# Altium footprint library Pasivos.PcbLib: 138 footprints (part 9 of 9)
Each footprint in its own frame and in the unit in brackets; x right, y up, seen from the top. Pads: shape width x height; smd on the part's side, far side on the other; paste and mask are expansions set on the pad; w line width, h text height; cw(c..) or ccw(c..) is an arc to the next point about the centre after c.
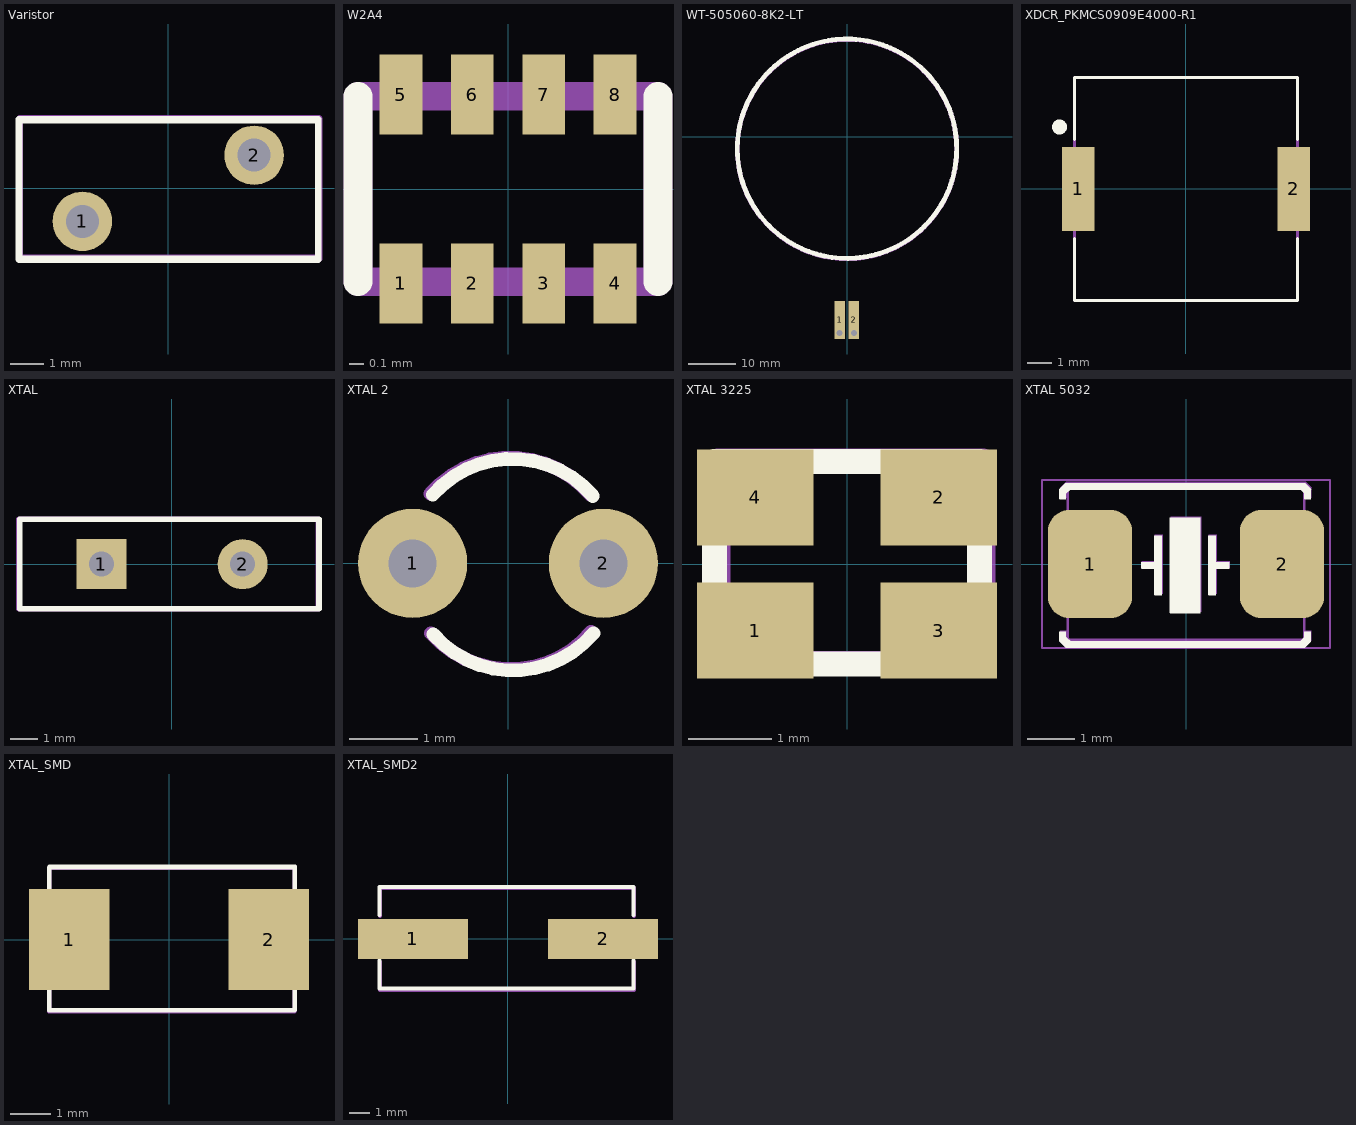
[diagram p8: the footprints below, top view; thin cyan lines are the x and y axes]

## Varistor [mm]
pads (2):
  round 1.8 hole 1: 1(-2.6,-1) 2(2.6,1)
Top Overlay:
  lines w0.2: -4.52,-2.155 4.544,-2.155 4.544,2.067 -4.52,2.067 -4.52,-2.155 ; -4.52,-2.128 -4.52,2.094 4.544,2.094 4.544,-2.128 -4.52,-2.128
Mechanical 29:
  lines w0.2: -4.503,-2.139 -4.503,2.084 4.561,2.084 4.561,-2.139 -4.503,-2.139 ; -4.503,-2.111 4.561,-2.111 4.561,2.111 -4.503,2.111 -4.503,-2.111
  text "'.Designator'" at -3.068,-0.259 h0.5
3D body "V47ZA.step": height 11, standoff -3, extent -4.469,-2.03 4.531,1.97

## W2A4 [mm] "Array capacitor 0508 x 4"
pads (8):
  rect 0.3x0.56 smd: 1(-0.75,-0.66) 2(-0.25,-0.66) 3(0.25,-0.66) 4(0.75,-0.66) 5(-0.75,0.66) 6(-0.25,0.66) 7(0.25,0.66) 8(0.75,0.66)
Top Overlay:
  lines w0.2: -1.05,-0.65 -1.05,0.65 ; 1.05,-0.65 1.05,0.65
Mechanical 15:
  lines w0.2: -1.05,-0.65 -1.05,0.65 1.05,0.65 1.05,-0.65 -1.05,-0.65

## WT-505060-8K2-LT [mm] "TX 1 COIL 1 LAYER 4.95UH"
pads (4):
  round 1.5 hole 1.2 paste+2: 1(-1.58,-41.1) 2(1.46,-41.1)
  rect 2.2x8 smd: 1(-1.56,-38.38) 2(1.44,-38.38)
Top Overlay:
  circle w1: c0,-2.479 r23
Mechanical 29:
  circle w1: c0,-2.57 r23
  text "'.Designator'" at -2.82,-0.127 h0.5

## XDCR_PKMCS0909E4000-R1 [mm] "AUDIO PIEZO TRANSDUCER 12.5V SMD"
pads (2):
  rect 1.3x3.4 smd: 1(-4.35,0) 2(4.35,0)
Top Overlay:
  circle w0.3: c-5.1,2.5 r0.15
  lines w0.127: -4.5,-2 -4.5,-4.5 4.5,-4.5 4.5,-2 ; -4.5,2 -4.5,4.5 4.5,4.5 4.5,2
Mechanical 4:
  lines w0.127: -4.5,-4.5 -4.5,4.5 ; -4.5,-4.5 4.5,-4.5 ; -4.5,-4.5 -4.5,4.5 ; -4.5,-4.5 4.5,-4.5 ; -4.5,4.5 4.5,4.5 ; -4.5,4.5 4.5,4.5 ; 4.5,-4.5 4.5,4.5 ; 4.5,-4.5 4.5,4.5
3D body "PKMCS0909E4000-R1.step": height 1.9, standoff 0, extent -4.5,-4.5 4.5,4.5

## XTAL [mm] "HC49"
pads (2):
  rect 1.8x1.8 hole 0.9: 1(-2.54,0)
  round 1.8 hole 0.9: 2(2.54,0)
Top Overlay:
  lines w0.2: -5.478,-1.601 -5.478,1.61 5.285,1.61 5.285,-1.601 -5.478,-1.601
Mechanical 29:
  lines w0.2: -5.498,-1.598 5.265,-1.598 5.265,1.613 -5.498,1.613 -5.498,-1.598
  text "'.Designator'" at -2.954,-0.198 h0.5
3D body "XTAL2.step": height 2.09, standoff -3.54, extent -5.407,-1.519 5.261,1.529

## XTAL 2 [mm]
pads (2):
  round 1.6 hole 0.7: 1(-1.397,0) 2(1.397,0)
Top Overlay:
  lines w0.2: -1.103,1.004 cw(c0.063,-0.018) 1.242,0.988 ; -1.093,-1.04 ccw(c0.073,-0.018) 1.252,-1.024
Mechanical 29:
  lines w0.2: -1.139,1.022 cw(c0.026,0) 1.205,1.006 ; -1.129,-1.022 ccw(c0.036,0) 1.215,-1.006
  text "'.Designator'" at -1.181,-0.341 h0.5
3D body "TC38 SMD.step": height 8.2, standoff -1.3, extent -1.395,-0.091 1.395,2.159

## XTAL 3225 [mm] "Crytal 32 x 25 mm"
pads (4):
  rect 1.4x1.15 smd: 1(-1.1,-0.8) 2(1.1,0.8) 3(1.1,-0.8) 4(-1.1,0.8)
Top Overlay:
  lines w0.3: -1.59,-1.2 -1.59,1.23 1.59,1.23 1.59,-1.18 1.57,-1.2 -1.59,-1.2
Mechanical 29:
  lines w0.3: -1.549,-1.195 -1.549,1.235 1.631,1.235 1.631,-1.175 1.611,-1.195 -1.549,-1.195
  text "'.Designator'" at -1.164,-0.157 h0.5
3D body "SMD 3225 Crystal.step": height 0.81, standoff 0, extent -1.587,-1.25 1.627,1.25

## XTAL 5032 [mil] "Crytal  0.197\" L x 0.126\" W (5.00mm x 3.20mm)"
height 47.24
pads (2):
  rrect50% 70x90 smd: 1(-80,0) 2(80,0)
Top Overlay:
  region: 103.98,-56.54 98.98,-56.54 98.98,-61.04 95.48,-64.54 -96.52,-64.54 -100.02,-61.04 -100.02,-56.54 -105.02,-56.54 -105.02,-64.54 -100.02,-69.54 98.98,-69.54 103.98,-64.54
  region: -105.02,54.46 -100.02,54.46 -100.02,58.96 -96.52,62.46 95.48,62.46 98.98,58.96 98.98,54.46 103.98,54.46 103.98,62.46 98.98,67.46 -100.02,67.46 -105.02,62.46
  region: -20.02,23.46 -26.02,23.46 -26.02,1.46 -37.02,1.46 -37.02,-3.54 -26.02,-3.54 -26.02,-25.54 -20.02,-25.54
  region: -13.02,38.46 11.98,38.46 11.98,-40.54 -13.02,-40.54
  region: 18.98,-25.54 24.98,-25.54 24.98,-3.54 35.98,-3.54 35.98,1.46 24.98,1.46 24.98,23.46 18.98,23.46
  lines w1: -105.02,-64.54 -100.02,-69.54 98.98,-69.54 103.98,-64.54 103.98,-56.54 98.98,-56.54 98.98,-61.04 95.48,-64.54 -96.52,-64.54 -100.02,-61.04 -100.02,-56.54 -105.02,-56.54 -105.02,-64.54 ; -105.02,54.46 -100.02,54.46 -100.02,58.96 -96.52,62.46 95.48,62.46 98.98,58.96 98.98,54.46 103.98,54.46 103.98,62.46 98.98,67.46 -100.02,67.46 -105.02,62.46 -105.02,54.46 ; -37.02,-3.54 -26.02,-3.54 -26.02,-25.54 -20.02,-25.54 -20.02,23.46 -26.02,23.46 -26.02,1.46 -37.02,1.46 -37.02,-3.54 ; -13.02,-40.54 11.98,-40.54 11.98,38.46 -13.02,38.46 -13.02,-40.54 ; 18.98,-25.54 18.98,23.46 24.98,23.46 24.98,1.46 35.98,1.46 35.98,-3.54 24.98,-3.54 24.98,-25.54 18.98,-25.54
Mechanical 13:
  lines w2: -98.43,-63 98.42,-63 98.43,-63 98.43,62.99 -98.43,62.99 -98.43,-63
Mechanical 14:
  lines w2: -120,-70 -120,70 120,70 120,-70 -120,-70
Mechanical 29:
  region: 19.5,-24.5 25.5,-24.5 25.5,-2.5 36.5,-2.5 36.5,2.5 25.5,2.5 25.5,24.5 19.5,24.5
  region: -12.5,39.5 12.5,39.5 12.5,-39.5 -12.5,-39.5
  region: -19.5,24.5 -25.5,24.5 -25.5,2.5 -36.5,2.5 -36.5,-2.5 -25.5,-2.5 -25.5,-24.5 -19.5,-24.5
  region: -104.5,55.5 -99.5,55.5 -99.5,60 -96,63.5 96,63.5 99.5,60 99.5,55.5 104.5,55.5 104.5,63.5 99.5,68.5 -99.5,68.5 -104.5,63.5
  region: 104.5,-55.5 99.5,-55.5 99.5,-60 96,-63.5 -96,-63.5 -99.5,-60 -99.5,-55.5 -104.5,-55.5 -104.5,-63.5 -99.5,-68.5 99.5,-68.5 104.5,-63.5
  lines w1: -104.5,-63.5 -104.5,-55.5 -99.5,-55.5 -99.5,-60 -96,-63.5 96,-63.5 99.5,-60 99.5,-55.5 104.5,-55.5 104.5,-63.5 99.5,-68.5 -99.5,-68.5 -104.5,-63.5 ; -104.5,55.5 -104.5,63.5 -99.5,68.5 99.5,68.5 104.5,63.5 104.5,55.5 99.5,55.5 99.5,60 96,63.5 -96,63.5 -99.5,60 -99.5,55.5 -104.5,55.5 ; -36.5,-2.5 -36.5,2.5 -25.5,2.5 -25.5,24.5 -19.5,24.5 -19.5,-24.5 -25.5,-24.5 -25.5,-2.5 -36.5,-2.5 ; -12.5,-39.5 -12.5,39.5 12.5,39.5 12.5,-39.5 -12.5,-39.5 ; 19.5,-24.5 25.5,-24.5 25.5,-2.5 36.5,-2.5 36.5,2.5 25.5,2.5 25.5,24.5 19.5,24.5 19.5,-24.5
  text "'.Designator'" at -100.38,81.47 h19.68
3D body "User Library-CRYSTALSMD5X32.STEP": height 39.37, standoff 0, extent -98.42,-63 98.43,62.99

## XTAL_SMD [mm]
pads (2):
  rect 2x2.5 smd: 1(-2.47,0) 2(2.47,0)
Top Overlay:
  lines w0.1: -2.973,-1.763 -2.973,1.793 3.113,1.793 3.113,-1.763 -2.973,-1.763 ; -2.958,-1.749 3.128,-1.749 3.128,1.807 -2.958,1.807 -2.958,-1.749
Mechanical 29:
  lines w0.1: -2.973,-1.778 3.113,-1.778 3.113,1.778 -2.973,1.778 -2.973,-1.778 ; -2.958,-1.763 -2.958,1.793 3.128,1.793 3.128,-1.763 -2.958,-1.763
  text "'.Designator'" at -3.219,-0.182 h0.5
3D body "XTAL_SMD.step": height 1, standoff -0.01, extent -2.915,-1.707 3.085,1.793
3D body "XTAL_SMD.step": height 1, standoff -0.01, extent -2.93,-1.722 3.07,1.778

## XTAL_SMD2 [mm] "HC49/US SMD"
pads (2):
  rect 5.5x2 smd: 1(-4.75,0) 2(4.75,0)
Top Overlay:
  lines w0.2: -6.431,-1.082 -6.431,-2.479 6.269,-2.479 6.269,-1.082 ; -6.431,1.204 -6.431,2.601 6.269,2.601 6.269,1.204
Mechanical 29:
  lines w0.2: -6.401,-1.143 -6.401,-2.54 6.299,-2.54 6.299,-1.143 ; -6.401,1.143 -6.401,2.54 6.299,2.54 6.299,1.143
  text "'.Designator'" at -5.847,-0.271 h0.5
3D body "SMU4.STEP": height 4.02, standoff 0.02, extent -6.301,-2.413 6.199,2.387